# Altium footprint library LOGTURTLE_APR_25_TX.PcbLib: 88 footprints (part 6 of 6)
Each footprint in its own frame and in the unit in brackets; x right, y up, seen from the top. Pads: shape width x height; smd on the part's side, far side on the other; paste and mask are expansions set on the pad; w line width, h text height; cw(c..) or ccw(c..) is an arc to the next point about the centre after c.
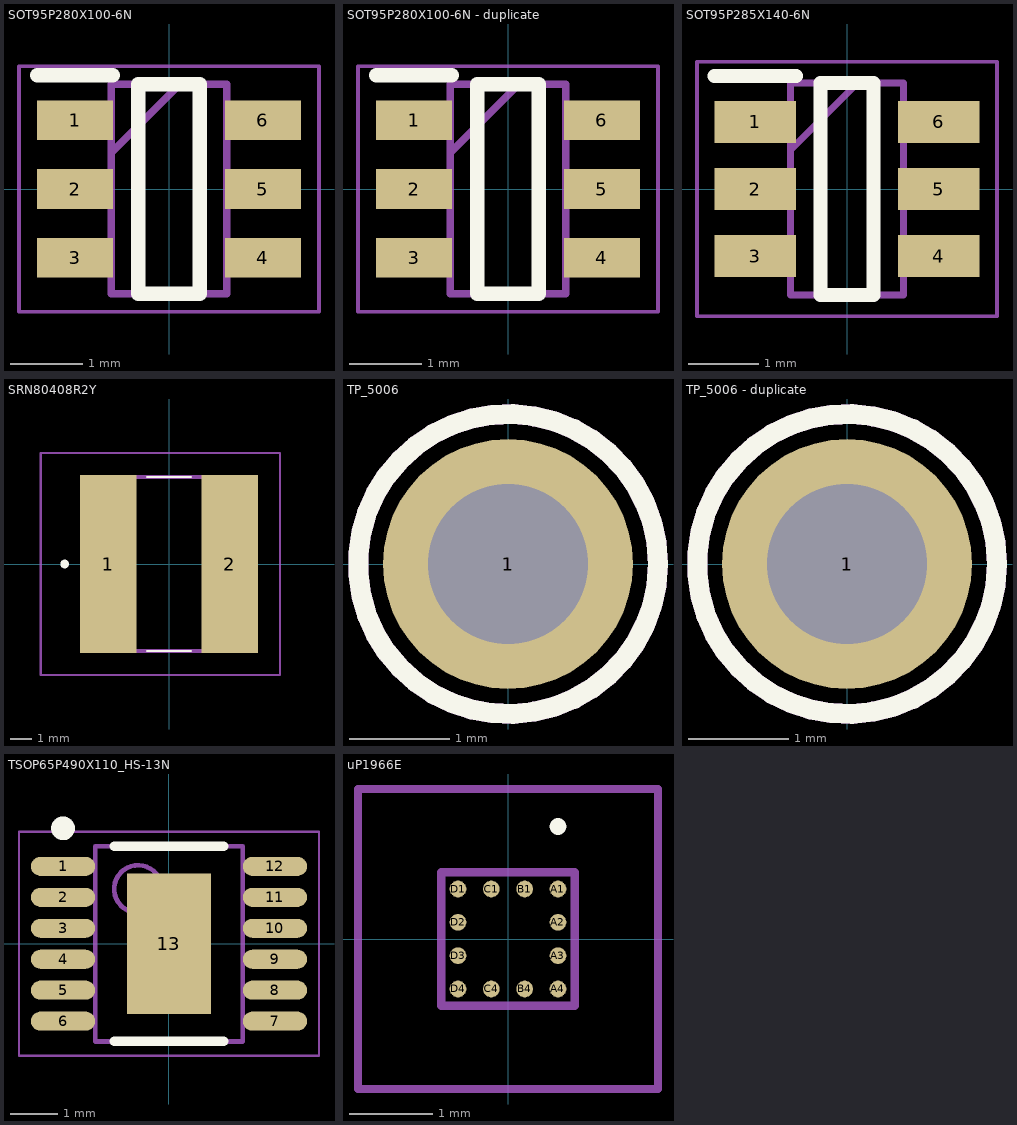
[diagram p5: the footprints below, top view; thin cyan lines are the x and y axes]

## SOT95P280X100-6N [mm]
pads (6):
  rect 1.05x0.55 smd: 1(-1.3,0.95) 2(-1.3,0) 3(-1.3,-0.95) 4(1.3,-0.95) 5(1.3,0) 6(1.3,0.95)
Top Overlay:
  lines w0.2: -1.825,1.575 -0.775,1.575 ; -0.425,-1.45 0.425,-1.45 0.425,1.45 -0.425,1.45 -0.425,-1.45
Mechanical 13:
  lines w0.1: -0.8,0.5 0.15,1.45 ; -0.8,-1.45 0.8,-1.45 0.8,1.45 -0.8,1.45 -0.8,-1.45
Mechanical 15:
  lines w0.05: -2.075,-1.7 2.075,-1.7 2.075,1.7 -2.075,1.7 -2.075,-1.7
3D body "DMN61D8LVT-7.stp": height 1, standoff 0, extent -1.4,-1.45 1.4,1.45

## SOT95P280X100-6N - duplicate [mm]
pads (6):
  rect 1.05x0.55 smd: 1(-1.3,0.95) 2(-1.3,0) 3(-1.3,-0.95) 4(1.3,-0.95) 5(1.3,0) 6(1.3,0.95)
Top Overlay:
  lines w0.2: -1.825,1.575 -0.775,1.575 ; -0.425,-1.45 -0.425,1.45 0.425,1.45 0.425,-1.45 -0.425,-1.45
Mechanical 13:
  lines w0.1: -0.8,0.5 0.15,1.45 ; -0.8,-1.45 -0.8,1.45 0.8,1.45 0.8,-1.45 -0.8,-1.45
Mechanical 15:
  lines w0.05: -2.075,-1.7 -2.075,1.7 2.075,1.7 2.075,-1.7 -2.075,-1.7
3D body "DMN61D8LVT-7.stp": height 1, standoff 0, extent -1.4,-1.45 1.4,1.45

## SOT95P285X140-6N [mm]
pads (6):
  rect 1.15x0.6 smd: 1(-1.3,0.95) 2(-1.3,0) 3(-1.3,-0.95) 4(1.3,-0.95) 5(1.3,0) 6(1.3,0.95)
Top Overlay:
  lines w0.2: -1.875,1.6 -0.725,1.6 ; -0.375,-1.5 -0.375,1.5 0.375,1.5 0.375,-1.5 -0.375,-1.5
Mechanical 13:
  lines w0.1: -0.8,0.55 0.15,1.5 ; -0.8,-1.5 -0.8,1.5 0.8,1.5 0.8,-1.5 -0.8,-1.5
Mechanical 15:
  lines w0.05: -2.125,-1.8 -2.125,1.8 2.125,1.8 2.125,-1.8 -2.125,-1.8
3D body "DMN601DMK-7.stp": height 1.4, standoff 0, extent -1.425,-1.5 1.425,1.5

## SRN80408R2Y [mm]
pads (2):
  rect 2.6x8.2 smd: 1(-2.8,0) 2(2.8,0)
Top Overlay:
  lines w0.1: -1,-4 1,-4 ; -1,4 1,4
  lines w0.2: -4.8,-0.1 cw(c-4.8,0) -4.8,0.1 cw(c-4.8,0) -4.8,-0.1
Mechanical 13:
  lines w0.2: -4,-4 -4,4 4,4 4,-4 -4,-4
Mechanical 15:
  lines w0.1: -5.9,-5.1 -5.9,5.1 5.1,5.1 5.1,-5.1 -5.9,-5.1
3D body "SRN8040-101M.stp": height 3.95, standoff 0, extent -3.98,-4.075 3.92,4.075

## TP_5006 [mm]
height 1.75
pads (1):
  round 2.5 hole 1.6 paste-2539.97: 1(0,0)
Top Overlay:
  circle w0.2: c0,0 r1.5
Mechanical 13:
  circle w0.2: c0,0 r1.5
  text ".Designator" at -3.048,-0.285 h1.5
3D body "5006.step": height 5.58, standoff -3.3, extent -1.576,-1.587 1.576,1.587

## TP_5006 - duplicate [mm]
height 1.75
pads (1):
  round 2.5 hole 1.6 paste-2539.97: 1(0,0)
Top Overlay:
  circle w0.2: c0,0 r1.5
Mechanical 13:
  circle w0.2: c0,0 r1.5
  text ".Designator" at -3.048,-0.285 h1.5
3D body "5006.step": height 5.58, standoff -3.3, extent -1.576,-1.587 1.576,1.587

## TSOP65P490X110_HS-13N [mm] "TSOP, 12-Leads, Body 4.04x3.00mm, Pitch 0.65mm, Thermal Pad 2.95x1.76mm, IPC Medium Density"
height 1.1
pads (13):
  oval 1.35x0.4 smd mask+0.05: 1(-2.225,1.625) 2(-2.225,0.975) 3(-2.225,0.325) 4(-2.225,-0.325) 5(-2.225,-0.975) 6(-2.225,-1.625) 7(2.225,-1.625) 8(2.225,-0.975) 9(2.225,-0.325) 10(2.225,0.325) 11(2.225,0.975) 12(2.225,1.625)
  rect 1.76x2.95 smd: 13(0,0)
Top Overlay:
  circle w0.25: c-2.225,2.425 r0.125
  lines w0.2: -1.15,-2.05 1.15,-2.05 ; -1.15,2.05 1.15,2.05
Mechanical 13:
  circle w0.1: c-0.65,1.15 r0.5
  lines w0.1: -1.55,-2.05 1.55,-2.05 1.55,2.05 -1.55,2.05 -1.55,-2.05
  text ".Designator" at 0.852,-1.8 h1.5
Mechanical 15:
  lines w0.05: -3.15,-2.35 3.15,-2.35 3.15,2.35 -3.15,2.35 -3.15,-2.35
  lines w0.1: -0.5,0 0.5,0 ; 0,-0.5 0,0.5
3D body "TSOP65P490X110_HS-13N.step": height 1.1, standoff 0, extent -2.449,-2.05 2.449,2.05

## uP1966E [mm]
pads (12):
  round 0.2 smd: A1(0.6,0.6) A2(0.6,0.2) A3(0.6,-0.2) A4(0.6,-0.6) B1(0.2,0.6) B4(0.2,-0.6) C1(-0.2,0.6) C4(-0.2,-0.6) D1(-0.6,0.6) D2(-0.6,0.2) D3(-0.6,-0.2) D4(-0.6,-0.6)
Top Overlay:
  lines w0.1: 0.6,1.3 ccw(c0.6,1.35) 0.6,1.4 ccw(c0.6,1.35) 0.6,1.3
Mechanical 13:
  lines w0.1: -0.8,-0.8 0.8,-0.8 0.8,0.8 -0.8,0.8 -0.8,-0.8
Mechanical 15:
  lines w0.1: -1.8,-1.8 1.8,-1.8 1.8,1.8 -1.8,1.8 -1.8,-1.8
3D body "uP1966E.stp": height 0.65, standoff 0, extent -0.8,-0.8 0.8,0.8